# Altium footprint library mobinbyn-Module.PcbLib: 93 footprints (part 1 of 6)
Each footprint in its own frame and in the unit in brackets; x right, y up, seen from the top. Pads: shape width x height; smd on the part's side, far side on the other; paste and mask are expansions set on the pad; w line width, h text height; cw(c..) or ccw(c..) is an arc to the next point about the centre after c.
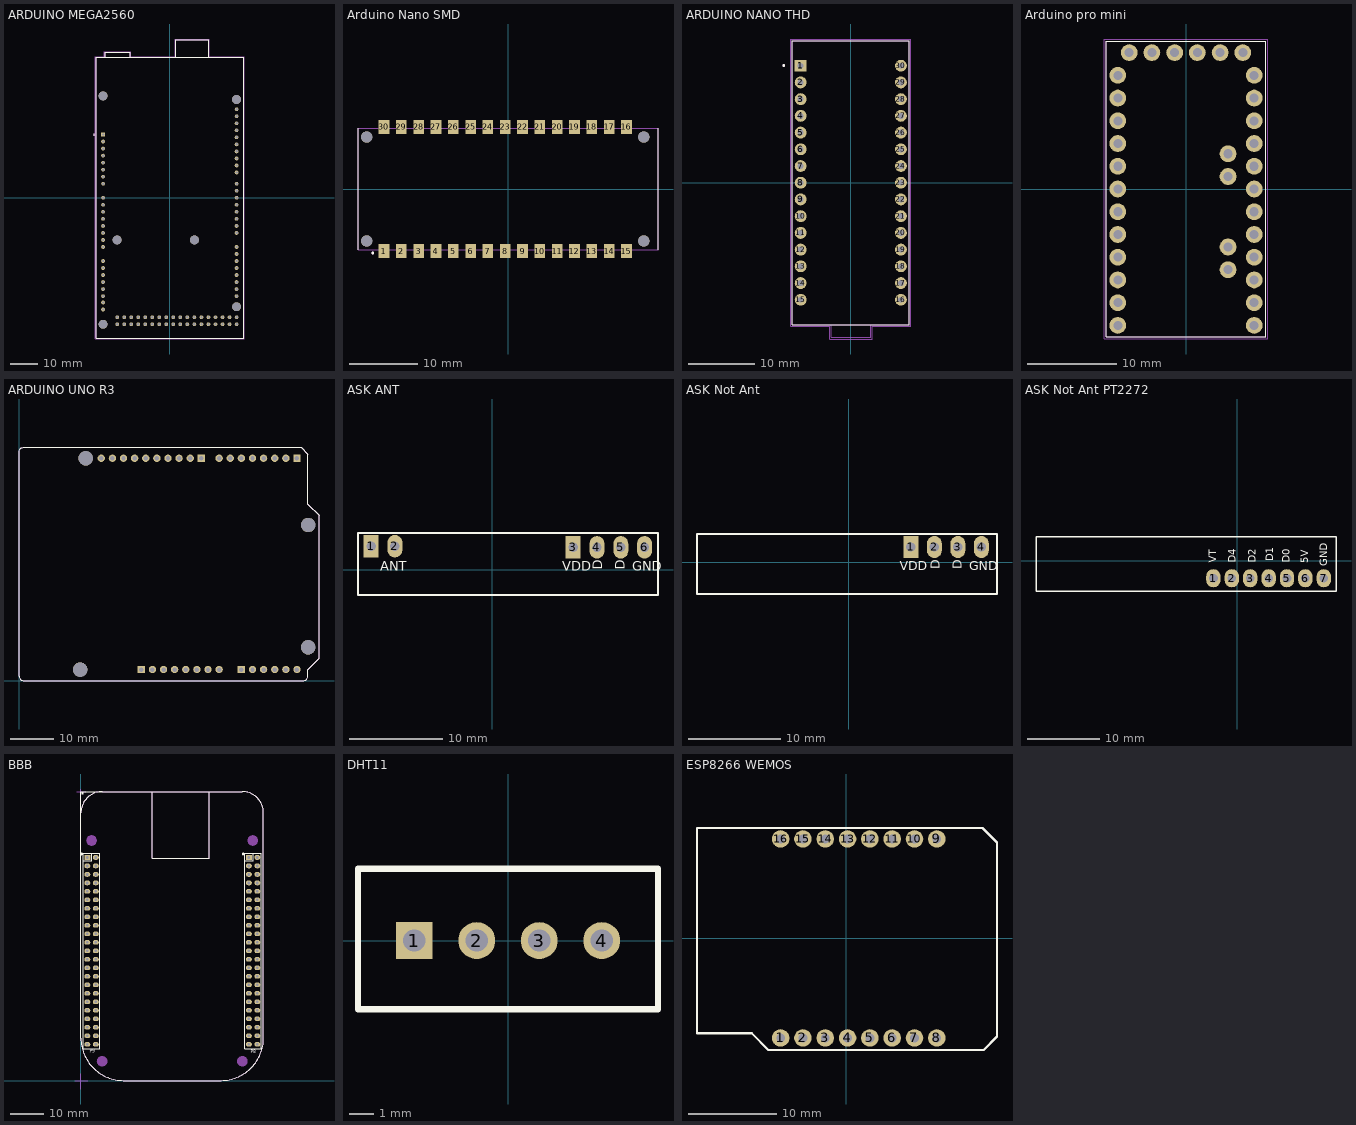
[diagram p0: the footprints below, top view; thin cyan lines are the x and y axes]

## ANT GSM 1 [mm]
3D body "User Library-SMA_AntennaR.step": height 4.61, standoff -42.25, extent -3.666,-7.728 5.334,10.522

## ANT GSM 2 [mm]
3D body "User Library-Antenna AP22A.step": height 0, standoff -51, extent -5.004,-3.988 4.496,5.512

## ANT GSM 3 [mm]
3D body "User Library-Antenna AP24A.step": height 4.61, standoff -46.75, extent -5.08,-3.658 5.42,15.342

## ANT GSM 4 [mm]
3D body "User Library-Antena Ethertronics P522309.STEP": height 36.03, standoff 3.36, extent -27.49,-1.418 72.83,14.274

## ANT GSM 5 [mm]
3D body "User Library-GSM_ANT.step": height 2.5, standoff -5, extent -0.254,-2.373 23.492,2.627

## ARDUINO MEGA2560 [mm]
pads (92):
  round 1.358 hole 0.85: 0(24.13,-12.7) 1(24.13,-10.16) 2(24.13,-7.62) 3(24.13,-5.08) 3V3(-24.13,15.24) 4(24.13,-2.54) 5(24.13,0) 5V_1(-24.13,12.7) 5V_2(24.13,-43.18) 5V_3(24.13,-45.72) 6(24.13,2.54) 7(24.13,5.08) 8(24.13,9.144) 9(24.13,11.684) 10(24.13,14.224) 11(24.13,16.764) 12(24.13,19.304) 13(24.13,21.844) 14(24.13,-17.78) 15(24.13,-20.32) 16(24.13,-22.86) 17(24.13,-25.4) 18(24.13,-27.94) 19(24.13,-30.48) 20(24.13,-33.02) 21(24.13,-35.56) 22(21.59,-43.18) 23(21.59,-45.72) 24(19.05,-43.18) 25(19.05,-45.72) 26(16.51,-43.18) 27(16.51,-45.72) 28(13.97,-43.18) 29(13.97,-45.72) 30(11.43,-43.18) 31(11.43,-45.72) 32(8.89,-43.18) 33(8.89,-45.72) 34(6.35,-43.18) 35(6.35,-45.72) 36(3.81,-43.18) 37(3.81,-45.72) 38(1.27,-43.18) 39(1.27,-45.72) 40(-1.27,-43.18) 41(-1.27,-45.72) 42(-3.81,-43.18) 43(-3.81,-45.72) 44(-6.35,-43.18) 45(-6.35,-45.72) 46(-8.89,-43.18) 47(-8.89,-45.72) 48(-11.43,-43.18) 49(-11.43,-45.72) 50(-13.97,-43.18) 51(-13.97,-45.72) 52(-16.51,-43.18) 53(-16.51,-45.72) AD0(-24.13,0) AD1(-24.13,-2.54) AD2(-24.13,-5.08) AD3(-24.13,-7.62) AD4(-24.13,-10.16) AD5(-24.13,-12.7) AD6(-24.13,-15.24) AD7(-24.13,-17.78) AD8(-24.13,-22.86) AD9(-24.13,-25.4) AD10(-24.13,-27.94) AD11(-24.13,-30.48) AD12(-24.13,-33.02) AD13(-24.13,-35.56) AD14(-24.13,-37.846) AD15(-24.13,-40.386) AREF(24.13,26.924) GND1(-24.13,10.16) GND2(-24.13,7.62) GND3(24.13,24.384) GND4(-19.05,-43.18) GND5(-19.05,-45.72) IOREF(-24.13,20.32) RESET(-24.13,17.78) SCL(24.13,32.004) SDA(24.13,29.464) VIN(-24.13,5.08)
  rect 1.358x1.358 hole 0.85: NC(-24.13,22.86)
  round 3.2 hole 3.2 unplated: ""(-24.13,-45.72) ""(-24.13,36.83) ""(-19.05,-15.24) ""(8.89,-15.24) ""(24.13,-39.37) ""(24.13,35.56)
Top Overlay:
  circle w0.24: c-27.4,22.81 r0.12
  lines w0.127: -23.37,50.8 -26.67,50.8 -26.67,-50.8 26.67,-50.8 26.67,50.8 14.02,50.8 ; -23.37,50.8 -14.378,50.8 ; -23.37,50.8 -23.37,52.61 -14.378,52.61 -14.378,50.8 ; -14.378,50.8 2.22,50.8 ; 2.22,50.8 14.02,50.8 ; 2.22,50.8 2.22,57.15 14.02,57.15 14.02,50.8
Mechanical 13:
  circle w0.24: c-27.4,22.81 r0.12
  lines w0.127: -23.37,50.8 -26.67,50.8 -26.67,-50.8 26.67,-50.8 26.67,50.8 14.02,50.8 ; -23.37,50.8 -14.378,50.8 ; -23.37,50.8 -23.37,52.61 -14.378,52.61 -14.378,50.8 ; -14.378,50.8 2.22,50.8 ; 2.22,50.8 14.02,50.8 ; 2.22,50.8 2.22,57.15 14.02,57.15 14.02,50.8
Mechanical 15:
  lines w0.05: -26.92,-51.05 26.92,-51.05 26.92,51.05 14.27,51.05 14.27,57.4 1.97,57.4 1.97,51.05 -14.128,51.05 -14.128,52.86 -23.62,52.86 -23.62,51.05 -26.92,51.05 -26.92,-51.05
3D body "ARDUINO MEGA2560.STEP": height 13.59, standoff -1.66, extent -26.67,-50.8 26.67,57.15

## Arduino Nano SMD [mm]
pads (34):
  rect 1.56x2 smd: 1(-18.19,-9.1) 2(-15.65,-9.1) 3(-13.11,-9.1) 4(-10.57,-9.1) 5(-8.03,-9.1) 6(-5.49,-9.1) 7(-2.95,-9.1) 8(-0.41,-9.1) 9(2.13,-9.1) 10(4.67,-9.1) 11(7.21,-9.1) 12(9.75,-9.1) 13(12.29,-9.1) 14(14.83,-9.1) 15(17.37,-9.1) 16(17.37,9.1) 17(14.83,9.1) 18(12.29,9.1) 19(9.75,9.1) 20(7.21,9.1) 21(4.67,9.1) 22(2.13,9.1) 23(-0.41,9.1) 24(-2.95,9.1) 25(-5.49,9.1) 26(-8.03,9.1) 27(-10.57,9.1) 28(-13.11,9.1) 29(-15.65,9.1) 30(-18.19,9.1)
  round 1.651 hole 1.651 unplated: ""(-20.73,-7.62) ""(-20.73,7.62) ""(19.91,-7.62) ""(19.91,7.62)
Top Overlay:
  circle w0.2: c-19.83,-9.4 r0.1
  lines w0.127: -22,-8.89 -22,8.89 ; 22,-8.89 22,8.89
Mechanical 13:
  circle w0.2: c-19.83,-9.4 r0.1
  lines w0.127: -22,-8.89 -22,8.89 ; -22,-8.89 -22,8.89 ; -22,-8.89 22,-8.89 22,8.89 -22,8.89
3D body "User Library-Arduino Nano 33 IoT.step": height 5.37, standoff 0.01, extent -22.001,-8.89 22.149,8.81

## ARDUINO NANO THD [mm]
pads (30):
  rect 1.8x1.8 hole 0.9: 1(-7.62,17.78)
  round 1.8 hole 0.9: 2(-7.62,15.24) 3(-7.62,12.7) 4(-7.62,10.16) 5(-7.62,7.62) 6(-7.62,5.08) 7(-7.62,2.54) 8(-7.62,0) 9(-7.62,-2.54) 10(-7.62,-5.08) 11(-7.62,-7.62) 12(-7.62,-10.16) 13(-7.62,-12.7) 14(-7.62,-15.24) 15(-7.62,-17.78) 16(7.62,-17.78) 17(7.62,-15.24) 18(7.62,-12.7) 19(7.62,-10.16) 20(7.62,-7.62) 21(7.62,-5.08) 22(7.62,-2.54) 23(7.62,0) 24(7.62,2.54) 25(7.62,5.08) 26(7.62,7.62) 27(7.62,10.16) 28(7.62,12.7) 29(7.62,15.24) 30(7.62,17.78)
Top Overlay:
  circle w0.2: c-10.2,17.8 r0.1
  lines w0.127: -8.89,-21.59 8.89,-21.59 8.89,21.59 -8.89,21.59 -8.89,-21.59
Mechanical 13:
  circle w0.2: c-10.2,17.8 r0.1
  lines w0.127: -2.97,-21.59 3,-21.59 ; -2.97,-21.59 -8.89,-21.59 -8.89,21.59 8.89,21.59 8.89,-21.59 3,-21.59 ; -2.97,-21.59 -2.97,-23.495 3,-23.495 3,-21.59
Mechanical 15:
  lines w0.05: -9.14,-21.84 -9.14,21.84 9.14,21.84 9.14,-21.84 3.25,-21.84 3.25,-23.745 -3.22,-23.745 -3.22,-21.84 -9.14,-21.84
3D body "User Library-arduino_nano.STEP": height 12.64, standoff -5.96, extent -9,-23.41 9,21.59

## Arduino pro mini [mil]
pads (34):
  round 74 hole 40: JP1_1(250,600) JP1_2(150,600) JP1_3(50,600) JP1_4(-50,600) JP1_5(-150,600) JP1_6(-250,600) JP2_1(185,55) JP2_2(185,155) JP3_1(185,-355) JP3_2(185,-255) JP6_1(300,500) JP6_2(300,400) JP6_3(300,300) JP6_4(300,200) JP6_5(300,100) JP6_6(300,0) JP6_7(300,-100) JP6_8(300,-200) JP6_9(300,-300) JP6_10(300,-400) JP6_11(300,-500) JP6_12(300,-600) JP7_1(-300,-600) JP7_2(-300,-500) JP7_3(-300,-400) JP7_4(-300,-300) JP7_5(-300,-200) JP7_6(-300,-100) JP7_7(-300,0) JP7_8(-300,100) JP7_9(-300,200) JP7_10(-300,300) JP7_11(-300,400) JP7_12(-300,500)
Top Overlay:
  lines w5: -350,-650 -350,650 350,650 350,-650 -350,-650
Mechanical 13:
  lines w5: -350,-650 -350,650 350,650 350,-650 -350,-650
Mechanical 15:
  lines w1.97: -359.84,-659.84 359.84,-659.84 359.84,659.84 -359.84,659.84 -359.84,-659.84
3D body "step_temp.STEP": height 575.8, standoff -307.29, extent -350,-650 350,650

## ARDUINO UNO R3 [mil]
pads (36):
  round 66 hole 40: 3V3(1400,100) 5V(1500,100) A1(2100,100) A2(2200,100) A3(2300,100) A4(2400,100) A4(SDA)(840,2000) A5(2500,100) A5(SCL)(740,2000) AREF(940,2000) D1(2400,2000) D2(2300,2000) D3(2200,2000) D4(2100,2000) D5(2000,2000) D6(1900,2000) D7(1800,2000) D9(1540,2000) D10(1440,2000) D11(1340,2000) D12(1240,2000) D13(1140,2000) GND_1(1700,100) GND_2(1600,100) GND_3(1040,2000) IOREF(1200,100) RST(1300,100) VIN(1800,100)
  rect 66x66 hole 40: A0(2000,100) D0(2500,2000) D8(1640,2000) P1(1100,100)
  round 129.92 hole 129.92 unplated: ""(550,100) ""(600,2000) ""(2600,300) ""(2600,1400)
Top Overlay:
  lines w5: 0,39.1 1.67,29.1 5,19.94 11.66,11.61 19.99,4.94 29.16,1.61 39.15,-0.05 2559.09,-0.05 2569.09,1.61 2578.26,4.94 2586.59,11.61 2593.25,19.94 2596.58,29.1 2598.25,39.1 2598.25,99.91 2698.21,199.87 2698.21,1488.59 2598.25,1588.55 2598.25,2038.39 2538.27,2098.37 39.15,2098.37 29.16,2096.7 19.99,2092.54 11.66,2086.71 5,2078.38 1.67,2069.21 0,2058.39 0,39.1
Mechanical 13:
  lines w5: 0,39.1 1.67,29.1 5,19.94 11.66,11.61 19.99,4.94 29.16,1.61 39.15,-0.05 2559.09,-0.05 2569.09,1.61 2578.26,4.94 2586.59,11.61 2593.25,19.94 2596.58,29.1 2598.25,39.1 2598.25,99.91 2698.21,199.87 2698.21,1488.59 2598.25,1588.55 2598.25,2038.39 2538.27,2098.37 39.15,2098.37 29.16,2096.7 19.99,2092.54 11.66,2086.71 5,2078.38 1.67,2069.21 0,2058.39 0,39.1
3D body "User Library-Arduino-UNO.STEP": height 578.48, standoff -7.97, extent -248.98,-15 2690,2083.43

## ASK ANT [mm]
pads (6):
  rect 1.6x2.4 hole 1: 1(-12.954,2.54) 3(8.636,2.413)
  oval 1.6x2.4 hole 1: 2(-10.414,2.54) 4(11.176,2.413) 5(13.716,2.413) 6(16.256,2.413)
Top Overlay:
  lines w0.2: -14.351,-2.667 -14.351,3.937 17.692,3.937 17.692,-2.667 -14.351,-2.667
  text "VDD" at 7.446,-0.087 h1
  text "D" at 11.746,0.013 h1
  text "D" at 14.146,0.013 h1
  text "GND" at 14.946,-0.087 h1
  text "ANT" at -11.954,-0.087 h1
3D body "User Library-RFM210LCF-433D.STEP": height 3.71, standoff -16, extent -14.351,-2.58 17.653,3.81

## ASK Not Ant [mm]
pads (4):
  rect 1.6x2.4 hole 1: 1(6.731,1.651)
  oval 1.6x2.4 hole 1: 2(9.271,1.651) 3(11.811,1.651) 4(14.351,1.651)
Top Overlay:
  lines w0.2: -16.383,-3.429 16.041,-3.429 16.041,3.048 -16.383,3.048 -16.383,-3.429
  text "GND" at 13.041,-0.849 h1
  text "D" at 12.241,-0.749 h1
  text "D" at 9.841,-0.749 h1
  text "VDD" at 5.541,-0.849 h1
3D body "User Library-RFM210LCF-433D_NoAnt.STEP": height 4.98, standoff -14.73, extent -16.256,-3.469 15.748,2.921

## ASK Not Ant PT2272 [mm]
pads (7):
  oval 2x2.5 hole 1.2: 1(-3.302,-2.413) 2(-0.762,-2.413) 3(1.778,-2.413) 4(4.318,-2.413) 5(6.858,-2.413) 6(9.398,-2.413) 7(11.938,-2.413)
Top Overlay:
  lines w0.2: -27.813,-4.191 13.628,-4.191 13.628,3.302 -27.813,3.302 -27.813,-4.191
  text "D4" at -0.233,-0.288 h1
  text "D2" at 2.561,-0.264 h1
  text "D1" at 4.974,-0.05 h1
  text "GND" at 12.446,-0.762 h1
  text "5V" at 9.779,-0.312 h1
  text "D0" at 7.239,-0.264 h1
  text "VT" at -2.921,-0.264 h1
3D body "User Library-XY_DJM_5V_RECEPTOR.STEP": height 4.99, standoff -23.01, extent -27.665,-3.952 13.335,3.048

## BBB [mm] "BeagleBoneBlack Board"
pads (188):
  round 1 on Mech1: 1(1.93,66.74) 1(50.23,66.74) 2(4.47,66.74) 2(52.77,66.74) 3(1.93,64.2) 3(50.23,64.2) 4(4.47,64.2) 4(52.77,64.2) 5(1.93,61.66) 5(50.23,61.66) 6(4.47,61.66) 6(52.77,61.66) 7(1.93,59.12) 7(50.23,59.12) 8(4.47,59.12) 8(52.77,59.12) 9(1.93,56.58) 9(50.23,56.58) 10(4.47,56.58) 10(52.77,56.58) 11(1.93,54.04) 11(50.23,54.04) 12(4.47,54.04) 12(52.77,54.04) 13(1.93,51.5) 13(50.23,51.5) 14(4.47,51.5) 14(52.77,51.5) 15(1.93,48.96) 15(50.23,48.96) 16(4.47,48.96) 16(52.77,48.96) 17(1.93,46.42) 17(50.23,46.42) 18(4.47,46.42) 18(52.77,46.42) 19(1.93,43.88) 19(50.23,43.88) 20(4.47,43.88) 20(52.77,43.88) 21(1.93,41.34) 21(50.23,41.34) 22(4.47,41.34) 22(52.77,41.34) 23(1.93,38.8) 23(50.23,38.8) 24(4.47,38.8) 24(52.77,38.8) 25(1.93,36.26) 25(50.23,36.26) 26(4.47,36.26) 26(52.77,36.26) 27(1.93,33.72) 27(50.23,33.72) 28(4.47,33.72) 28(52.77,33.72) 29(1.93,31.18) 29(50.23,31.18) 30(4.47,31.18) 30(52.77,31.18) 31(1.93,28.64) 31(50.23,28.64) 32(4.47,28.64) 32(52.77,28.64) 33(1.93,26.1) 33(50.23,26.1) 34(4.47,26.1) 34(52.77,26.1) 35(1.93,23.56) 35(50.23,23.56) 36(4.47,23.56) 36(52.77,23.56) 37(1.93,21.02) 37(50.23,21.02) 38(4.47,21.02) 38(52.77,21.02) 39(1.93,18.48) 39(50.23,18.48) 40(4.47,18.48) 40(52.77,18.48) 41(1.93,15.94) 41(50.23,15.94) 42(4.47,15.94) 42(52.77,15.94) 43(1.93,13.4) 43(50.23,13.4) 44(4.47,13.4) 44(52.77,13.4) 45(1.93,10.86) 45(50.23,10.86) 46(4.47,10.86) 46(52.77,10.86)
  rect 1.8x1.4 / inner rect 1.2x1.2 / far side rect 1.4x1.4 hole 0.8: A1(1.93,66.74) B1(50.23,66.74)
  oval 1.8x1.4 / inner round 1.2 / far side round 1.4 hole 0.8: A2(4.47,66.74) A3(1.93,64.2) A4(4.47,64.2) A5(1.93,61.66) A6(4.47,61.66) A7(1.93,59.12) A8(4.47,59.12) A9(1.93,56.58) A10(4.47,56.58) A11(1.93,54.04) A12(4.47,54.04) A13(1.93,51.5) A14(4.47,51.5) A15(1.93,48.96) A16(4.47,48.96) A17(1.93,46.42) A18(4.47,46.42) A19(1.93,43.88) A20(4.47,43.88) A21(1.93,41.34) A22(4.47,41.34) A23(1.93,38.8) A24(4.47,38.8) A25(1.93,36.26) A26(4.47,36.26) A27(1.93,33.72) A28(4.47,33.72) A29(1.93,31.18) A30(4.47,31.18) A31(1.93,28.64) A32(4.47,28.64) A33(1.93,26.1) A34(4.47,26.1) A35(1.93,23.56) A36(4.47,23.56) A37(1.93,21.02) A38(4.47,21.02) A39(1.93,18.48) A40(4.47,18.48) A41(1.93,15.94) A42(4.47,15.94) A43(1.93,13.4) A44(4.47,13.4) A45(1.93,10.86) A46(4.47,10.86) B2(52.77,66.74) B3(50.23,64.2) B4(52.77,64.2) B5(50.23,61.66) B6(52.77,61.66) B7(50.23,59.12) B8(52.77,59.12) B9(50.23,56.58) B10(52.77,56.58) B11(50.23,54.04) B12(52.77,54.04) B13(50.23,51.5) B14(52.77,51.5) B15(50.23,48.96) B16(52.77,48.96) B17(50.23,46.42) B18(52.77,46.42) B19(50.23,43.88) B20(52.77,43.88) B21(50.23,41.34) B22(52.77,41.34) B23(50.23,38.8) B24(52.77,38.8) B25(50.23,36.26) B26(52.77,36.26) B27(50.23,33.72) B28(52.77,33.72) B29(50.23,31.18) B30(52.77,31.18) B31(50.23,28.64) B32(52.77,28.64) B33(50.23,26.1) B34(52.77,26.1) B35(50.23,23.56) B36(52.77,23.56) B37(50.23,21.02) B38(52.77,21.02) B39(50.23,18.48) B40(52.77,18.48) B41(50.23,15.94) B42(52.77,15.94) B43(50.23,13.4) B44(52.77,13.4) B45(50.23,10.86) B46(52.77,10.86)
  round 3.2 on Mech1: ""(3.2,71.8) ""(6.35,5.8) ""(48.3,5.8) ""(51.4,71.8)
Top Overlay:
  circle w0.2: c48.5,67.8 r0.2
  circle w0.2: c0.2,67.8 r0.2
  circle w0.2: c0.505,85.915 r0.2
  lines w0.2: 0.7,65.8 3.2,65.8 3.2,68 ; 21.3,86.3 21.3,66.5 38.4,66.5 38.4,86.3 ; 49,65.8 51.5,65.8 51.5,68 ; 0,80.05 cw(c6.35,80.05) 6.35,86.4 ; 0,80.05 0,12.74 ccw(c12.7,12.74) 12.7,0.04 41.91,0.04 ccw(c41.91,12.74) 54.61,12.74 54.61,80.05 ccw(c48.26,80.05) 48.26,86.4 6.35,86.4 ; 0,80.05 0,86.4 6.35,86.4 ; 0.7,9.6 5.7,9.6 5.7,68 0.7,68 0.7,9.6 ; 49,9.6 54,9.6 54,68 49,68 49,9.6
  text "P8" at 50.805,8.115 h1
  text "P9" at 2.605,8.315 h1
Bottom Overlay:
  circle w0.2: c48.5,67.85 r0.2
  circle w0.2: c0.2,67.85 r0.2
  lines w0.2: 0.7,65.8 3.1,65.8 3.1,68 ; 49,65.8 51.4,65.8 51.4,68 ; 0.7,9.6 0.7,68 5.7,68 5.7,9.6 0.7,9.6 ; 49,9.6 49,68 54,68 54,9.6 49,9.6
  text "P8" at 52.205,8.115 h1
  text "P9" at 4.005,8.315 h1
Mechanical 1:
  lines w0.2: -1.9,0 2.1,0 ; -1.3,86.4 1.3,86.4 ; 0,-2.5 0,2 ; 0,85.6 0,87.2 ; 21.3,86.3 21.3,66.5 38.4,66.5 38.4,86.3 ; 0,12.74 ccw(c12.7,12.74) 12.7,0.04 41.91,0.04 ccw(c41.91,12.74) 54.61,12.74 54.61,80.05 ccw(c48.26,80.05) 48.26,86.4 6.35,86.4 ccw(c6.35,80.05) 0,80.05 0,12.74
3D body "PIN.STEP": height 8.43, standoff -2.49, extent 3.2,9.59 5.74,12.13
3D body "PIN.STEP": height 8.43, standoff -2.49, extent 0.66,9.59 3.2,12.13
3D body "PIN.STEP": height 8.43, standoff -2.49, extent 3.2,65.47 5.74,68.01
3D body "PIN_mid.STEP": height 8.43, standoff -2.49, extent 0.66,60.39 3.2,62.93
3D body "PIN_mid.STEP": height 8.43, standoff -2.49, extent 0.66,57.85 3.2,60.39
3D body "PIN_mid.STEP": height 8.43, standoff -2.49, extent 0.66,55.31 3.2,57.85
3D body "PIN_mid.STEP": height 8.43, standoff -2.49, extent 0.66,52.77 3.2,55.31
3D body "PIN_mid.STEP": height 8.43, standoff -2.49, extent 0.66,50.23 3.2,52.77
3D body "PIN_mid.STEP": height 8.43, standoff -2.49, extent 0.66,47.69 3.2,50.23
3D body "PIN_mid.STEP": height 8.43, standoff -2.49, extent 0.66,45.15 3.2,47.69
3D body "PIN_mid.STEP": height 8.43, standoff -2.49, extent 0.66,42.61 3.2,45.15
3D body "PIN_mid.STEP": height 8.43, standoff -2.49, extent 0.66,40.07 3.2,42.61
3D body "PIN_mid.STEP": height 8.43, standoff -2.49, extent 0.66,37.53 3.2,40.07
3D body "PIN_mid.STEP": height 8.43, standoff -2.49, extent 0.66,34.99 3.2,37.53
3D body "PIN_mid.STEP": height 8.43, standoff -2.49, extent 0.66,32.45 3.2,34.99
3D body "PIN_mid.STEP": height 8.43, standoff -2.49, extent 0.66,29.91 3.2,32.45
3D body "PIN_mid.STEP": height 8.43, standoff -2.49, extent 0.66,27.37 3.2,29.91
3D body "PIN_mid.STEP": height 8.43, standoff -2.49, extent 0.66,24.83 3.2,27.37
3D body "PIN_mid.STEP": height 8.43, standoff -2.49, extent 0.66,22.29 3.2,24.83
3D body "PIN_mid.STEP": height 8.43, standoff -2.49, extent 0.66,19.75 3.2,22.29
3D body "PIN_mid.STEP": height 8.43, standoff -2.49, extent 0.66,17.21 3.2,19.75
3D body "PIN_mid.STEP": height 8.43, standoff -2.49, extent 0.66,14.67 3.2,17.21
3D body "PIN_mid.STEP": height 8.43, standoff -2.49, extent 0.66,62.93 3.2,65.47
3D body "PIN_mid.STEP": height 8.43, standoff -2.49, extent 3.2,62.93 5.74,65.47
3D body "PIN_mid.STEP": height 8.43, standoff -2.49, extent 3.2,60.39 5.74,62.93
3D body "PIN_mid.STEP": height 8.43, standoff -2.49, extent 3.2,57.85 5.74,60.39
3D body "PIN_mid.STEP": height 8.43, standoff -2.49, extent 3.2,55.31 5.74,57.85
3D body "PIN_mid.STEP": height 8.43, standoff -2.49, extent 3.2,52.77 5.74,55.31
3D body "PIN_mid.STEP": height 8.43, standoff -2.49, extent 3.2,50.23 5.74,52.77
3D body "PIN_mid.STEP": height 8.43, standoff -2.49, extent 3.2,47.69 5.74,50.23
3D body "PIN_mid.STEP": height 8.43, standoff -2.49, extent 3.2,45.15 5.74,47.69
3D body "PIN_mid.STEP": height 8.43, standoff -2.49, extent 3.2,42.61 5.74,45.15
3D body "PIN_mid.STEP": height 8.43, standoff -2.49, extent 3.2,40.07 5.74,42.61
3D body "PIN_mid.STEP": height 8.43, standoff -2.49, extent 3.2,37.53 5.74,40.07
3D body "PIN_mid.STEP": height 8.43, standoff -2.49, extent 3.2,34.99 5.74,37.53
3D body "PIN_mid.STEP": height 8.43, standoff -2.49, extent 3.2,32.45 5.74,34.99
3D body "PIN_mid.STEP": height 8.43, standoff -2.49, extent 3.2,29.91 5.74,32.45
3D body "PIN_mid.STEP": height 8.43, standoff -2.49, extent 3.2,27.37 5.74,29.91
3D body "PIN_mid.STEP": height 8.43, standoff -2.49, extent 3.2,24.83 5.74,27.37
3D body "PIN_mid.STEP": height 8.43, standoff -2.49, extent 3.2,22.29 5.74,24.83
3D body "PIN_mid.STEP": height 8.43, standoff -2.49, extent 3.2,19.75 5.74,22.29
3D body "PIN_mid.STEP": height 8.43, standoff -2.49, extent 3.2,17.21 5.74,19.75
3D body "PIN_mid.STEP": height 8.43, standoff -2.49, extent 3.2,14.67 5.74,17.21
3D body "PIN.STEP": height 8.43, standoff -2.49, extent 0.66,65.47 3.2,68.01
3D body "PIN.STEP": height 8.43, standoff -2.49, extent 0.66,12.13 3.2,14.67
3D body "PIN.STEP": height 8.43, standoff -2.49, extent 3.2,12.13 5.74,14.67
3D body "PIN.STEP": height 8.43, standoff -2.49, extent 51.5,12.13 54.04,14.67
3D body "PIN.STEP": height 8.43, standoff -2.49, extent 48.96,12.13 51.5,14.67
3D body "PIN.STEP": height 8.43, standoff -2.49, extent 48.96,65.47 51.5,68.01
3D body "PIN_mid.STEP": height 8.43, standoff -2.49, extent 51.5,14.67 54.04,17.21
3D body "PIN_mid.STEP": height 8.43, standoff -2.49, extent 51.5,17.21 54.04,19.75
3D body "PIN_mid.STEP": height 8.43, standoff -2.49, extent 51.5,19.75 54.04,22.29
3D body "PIN_mid.STEP": height 8.43, standoff -2.49, extent 51.5,22.29 54.04,24.83
3D body "PIN_mid.STEP": height 8.43, standoff -2.49, extent 51.5,24.83 54.04,27.37
3D body "PIN_mid.STEP": height 8.43, standoff -2.49, extent 51.5,27.37 54.04,29.91
3D body "PIN_mid.STEP": height 8.43, standoff -2.49, extent 51.5,29.91 54.04,32.45
3D body "PIN_mid.STEP": height 8.43, standoff -2.49, extent 51.5,32.45 54.04,34.99
3D body "PIN_mid.STEP": height 8.43, standoff -2.49, extent 51.5,34.99 54.04,37.53
3D body "PIN_mid.STEP": height 8.43, standoff -2.49, extent 51.5,37.53 54.04,40.07
3D body "PIN_mid.STEP": height 8.43, standoff -2.49, extent 51.5,40.07 54.04,42.61
3D body "PIN_mid.STEP": height 8.43, standoff -2.49, extent 51.5,42.61 54.04,45.15
3D body "PIN_mid.STEP": height 8.43, standoff -2.49, extent 51.5,45.15 54.04,47.69
3D body "PIN_mid.STEP": height 8.43, standoff -2.49, extent 51.5,47.69 54.04,50.23
3D body "PIN_mid.STEP": height 8.43, standoff -2.49, extent 51.5,50.23 54.04,52.77
3D body "PIN_mid.STEP": height 8.43, standoff -2.49, extent 51.5,52.77 54.04,55.31
3D body "PIN_mid.STEP": height 8.43, standoff -2.49, extent 51.5,55.31 54.04,57.85
3D body "PIN_mid.STEP": height 8.43, standoff -2.49, extent 51.5,57.85 54.04,60.39
3D body "PIN_mid.STEP": height 8.43, standoff -2.49, extent 51.5,60.39 54.04,62.93
3D body "PIN_mid.STEP": height 8.43, standoff -2.49, extent 51.5,62.93 54.04,65.47
3D body "PIN_mid.STEP": height 8.43, standoff -2.49, extent 48.96,62.93 51.5,65.47
3D body "PIN_mid.STEP": height 8.43, standoff -2.49, extent 48.96,14.67 51.5,17.21
3D body "PIN_mid.STEP": height 8.43, standoff -2.49, extent 48.96,17.21 51.5,19.75
3D body "PIN_mid.STEP": height 8.43, standoff -2.49, extent 48.96,19.75 51.5,22.29
3D body "PIN_mid.STEP": height 8.43, standoff -2.49, extent 48.96,22.29 51.5,24.83
3D body "PIN_mid.STEP": height 8.43, standoff -2.49, extent 48.96,24.83 51.5,27.37
3D body "PIN_mid.STEP": height 8.43, standoff -2.49, extent 48.96,27.37 51.5,29.91
3D body "PIN_mid.STEP": height 8.43, standoff -2.49, extent 48.96,29.91 51.5,32.45
3D body "PIN_mid.STEP": height 8.43, standoff -2.49, extent 48.96,32.45 51.5,34.99
3D body "PIN_mid.STEP": height 8.43, standoff -2.49, extent 48.96,34.99 51.5,37.53
3D body "PIN_mid.STEP": height 8.43, standoff -2.49, extent 48.96,37.53 51.5,40.07
3D body "PIN_mid.STEP": height 8.43, standoff -2.49, extent 48.96,40.07 51.5,42.61
3D body "PIN_mid.STEP": height 8.43, standoff -2.49, extent 48.96,42.61 51.5,45.15
3D body "PIN_mid.STEP": height 8.43, standoff -2.49, extent 48.96,45.15 51.5,47.69
3D body "PIN_mid.STEP": height 8.43, standoff -2.49, extent 48.96,47.69 51.5,50.23
3D body "PIN_mid.STEP": height 8.43, standoff -2.49, extent 48.96,50.23 51.5,52.77
3D body "PIN_mid.STEP": height 8.43, standoff -2.49, extent 48.96,52.77 51.5,55.31
3D body "PIN_mid.STEP": height 8.43, standoff -2.49, extent 48.96,55.31 51.5,57.85
3D body "PIN_mid.STEP": height 8.43, standoff -2.49, extent 48.96,57.85 51.5,60.39
3D body "PIN_mid.STEP": height 8.43, standoff -2.49, extent 48.96,60.39 51.5,62.93
3D body "PIN.STEP": height 8.43, standoff -2.49, extent 51.5,65.47 54.04,68.01
3D body "PIN.STEP": height 8.43, standoff -2.49, extent 48.96,9.59 51.5,12.13
3D body "PIN.STEP": height 8.43, standoff -2.49, extent 51.5,9.59 54.04,12.13
3D body "BEAGLEBONE_BLACK.STEP": height 1.34, standoff -18.03, extent -0.06,-1.625 54.6,88.825

## DHT11 [mm]
pads (4):
  rect 1.5x1.5 hole 0.9: 1(-3.81,0)
  round 1.5 hole 0.9: 2(-1.27,0) 3(1.27,0) 4(3.81,0)
Top Overlay:
  lines w0.254: -6.096,-2.794 6.096,-2.794 6.096,2.921 -6.096,2.921 -6.096,-2.794
3D body "DHT11.step": height 18.25, standoff -5.25, extent -6.025,-2.749 5.975,2.751

## ESP8266 WEMOS [mm]
pads (16):
  round 2 hole 1 mask+0.1: 1(-7.493,-11.333) 2(-4.953,-11.333) 3(-2.413,-11.333) 4(0.127,-11.333) 5(2.667,-11.333) 6(5.207,-11.333) 7(7.747,-11.333) 8(10.287,-11.333) 9(10.287,11.328) 10(7.747,11.328) 11(5.207,11.328) 12(2.667,11.328) 13(0.127,11.328) 14(-2.413,11.328) 15(-4.953,11.328) 16(-7.493,11.328)
Top Overlay:
  lines w0.254: -17.018,-10.795 -10.795,-10.795 -8.89,-12.7 -8.382,-12.7 15.621,-12.7 17.145,-11.176 17.145,10.922 15.494,12.573 -17.018,12.573 -17.018,-10.795
3D body "User Library-WeMos.STEP": height 1.47, standoff -10.51, extent -17.272,-12.7 17.145,12.6